# Altium footprint library eLIB.PcbLib: 206 footprints (part 6 of 13)
Each footprint in its own frame and in the unit in brackets; x right, y up, seen from the top. Pads: shape width x height; smd on the part's side, far side on the other; paste and mask are expansions set on the pad; w line width, h text height; cw(c..) or ccw(c..) is an arc to the next point about the centre after c.
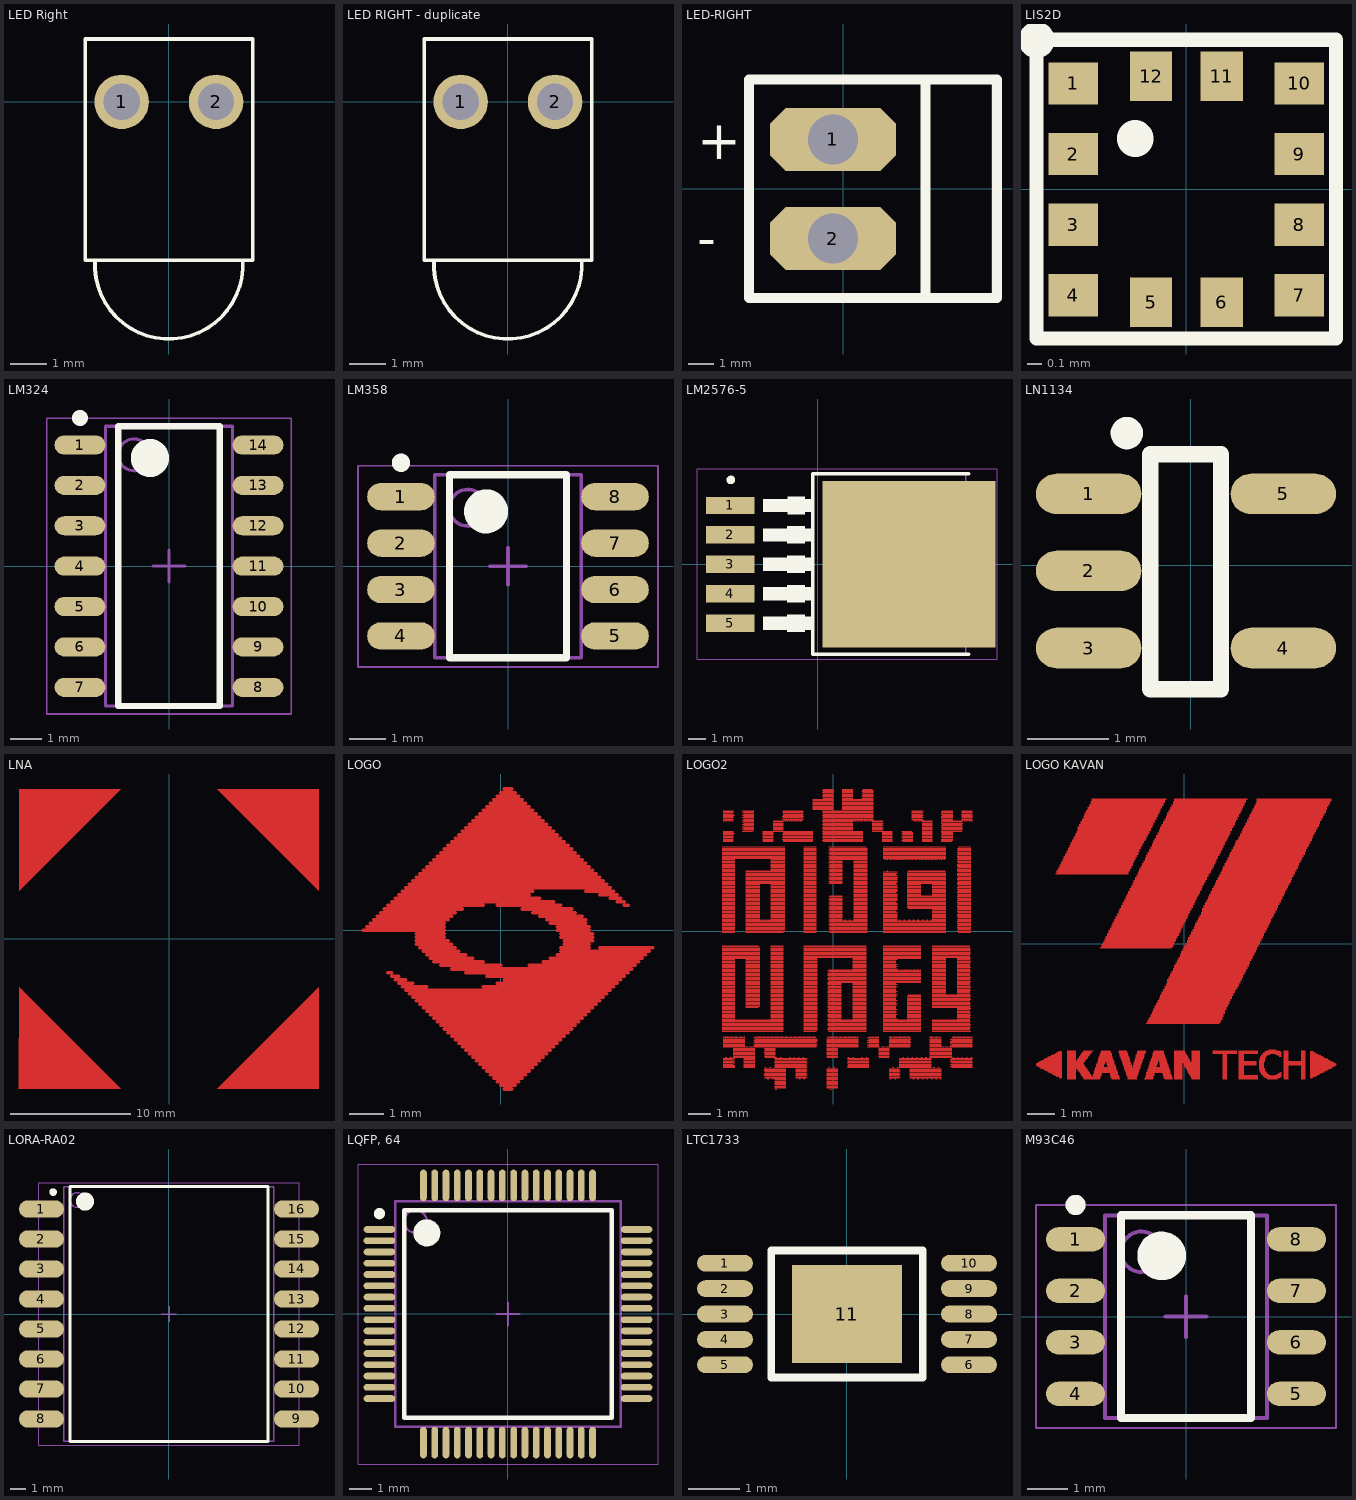
[diagram p5: the footprints below, top view; thin cyan lines are the x and y axes]

## LED Right [mm] "stand LED enclosured"
pads (2):
  round 1.5 hole 1: 1(-1.3,0) 2(1.3,0)
Top Overlay:
  lines w0.1: -2.032,-4.36 ccw(c0,-4.493) 2.032,-4.36 ; -2.3,-4.36 -2.3,1.73 2.31,1.73 2.31,-4.36 -2.3,-4.36
3D body "single LED indicator.STEP": height 6, standoff -3.35, extent -2.25,-6.53 2.25,1.67

## LED RIGHT - duplicate [mm]
pads (2):
  round 1.5 hole 1: 1(-1.3,0) 2(1.3,0)
Top Overlay:
  lines w0.1: -2.032,-4.36 ccw(c0,-4.493) 2.032,-4.36 ; -2.3,-4.36 2.31,-4.36 2.31,1.73 -2.3,1.73 -2.3,-4.36
3D body "single LED indicator.STEP": height 6, standoff -3.35, extent -2.25,-6.53 2.25,1.67

## LED-RIGHT [mil]
pads (2):
  oct 198x99 hole 78.74: 1(-16.61,77.36) 2(-16.61,-78.64)
Top Overlay:
  lines w10: -17.01,171.36 -16.61,170.97
  lines w16: 133.29,-172.15 -148.43,-172.15 -148.43,171.36 133.39,171.36 ; 129.13,-172.15 241.34,-172.15 241.34,171.36 129.13,171.36 129.13,-172.15
  text "+" at -230.31,46.46 h60
  text "-" at -230.31,-107.48 h60
Mechanical 13:
  lines w3.94: -143.31,-175 -143.31,175 235,175 235,-175 -143.31,-175
3D body: height 295.28, standoff -98.43, extent -44.16,-106.19 10.95,-51.08
3D body: height 295.28, standoff -98.43, extent -44.16,49.81 10.95,104.92
3D body: height 118.11, standoff 0, extent -144.09,-175 133.39,175
3D body: height 393.7, standoff 0, extent 133.39,-180 233.39,170

## LIS2D [mm] "accelerator"
pads (12):
  rect 0.35x0.3 smd: 1(-0.8,0.75) 2(-0.8,0.25) 3(-0.8,-0.25) 4(-0.8,-0.75) 7(0.8,-0.75) 8(0.8,-0.25) 9(0.8,0.25) 10(0.8,0.75)
  rect 0.3x0.35 smd: 5(-0.25,-0.8) 6(0.25,-0.8) 11(0.25,0.8) 12(-0.25,0.8)
Top Overlay:
  circle w0.254: c-1.062,1.06 r0.002
  circle w0.254: c-0.363,0.36 r0.002
  lines w0.1: -1.062,-1.057 1.06,-1.057 1.06,1.06 -1.062,1.06 -1.062,-1.057
3D body "User Library-LGA12_LIS2DS12.STEP": height 0.96, standoff 0, extent -0.997,-1 1.003,1

## LM324 [mm] "SOIC, 14-Leads, Body 8.65x3.90mm, Pitch 1.27mm, IPC Medium Density"
height 2.65
pads (14):
  oval 1.6x0.6 smd: 1(-2.8,3.81) 2(-2.8,2.54) 3(-2.8,1.27) 4(-2.8,0) 5(-2.8,-1.27) 6(-2.8,-2.54) 7(-2.8,-3.81) 8(2.8,-3.81) 9(2.8,-2.54) 10(2.8,-1.27) 11(2.8,0) 12(2.8,1.27) 13(2.8,2.54) 14(2.8,3.81)
Top Overlay:
  circle w0.6: c-0.6,3.4 r0.3
  circle w0.25: c-2.8,4.66 r0.125
  lines w0.2: -1.6,-4.4 1.6,-4.4 1.6,4.4 -1.6,4.4 -1.6,-4.4
Mechanical 13:
  circle w0.1: c-1.1,3.5 r0.5
  lines w0.1: -2,-4.4 2,-4.4 2,4.4 -2,4.4 -2,-4.4
Mechanical 15:
  lines w0.05: -3.85,-4.65 3.85,-4.65 3.85,4.65 -3.85,4.65 -3.85,-4.65
  lines w0.1: -0.5,0 0.5,0 ; 0,-0.5 0,0.5
3D body "SOIC127P610X265-14N.step": height 2.65, standoff 0, extent -3.075,-4.4 3.075,4.4

## LM358 [mm] "SOIC, 8-Leads, Body 4.90x3.90mm, Pitch 1.27mm, IPC Medium Density"
height 1.35
pads (8):
  oval 1.85x0.75 smd: 1(-2.925,1.905) 2(-2.925,0.635) 3(-2.925,-0.635) 4(-2.925,-1.905) 5(2.925,-1.905) 6(2.925,-0.635) 7(2.925,0.635) 8(2.925,1.905)
Top Overlay:
  circle w0.25: c-2.925,2.83 r0.125
  circle w0.6: c-0.6,1.5 r0.3
  lines w0.2: -1.6,-2.5 -1.6,2.5 1.6,2.5 1.6,-2.5 -1.6,-2.5
Mechanical 13:
  circle w0.1: c-1.1,1.6 r0.5
  lines w0.1: -2,-2.5 -2,2.5 2,2.5 2,-2.5 -2,-2.5
Mechanical 15:
  lines w0.05: -4.1,-2.75 -4.1,2.75 4.1,2.75 4.1,-2.75 -4.1,-2.75
  lines w0.1: -0.5,0 0.5,0 ; 0,-0.5 0,0.5
3D body "LM358.step": height 1.35, standoff 0, extent -3.25,-2.5 3.25,2.5

## LM2576-5 [mm]
pads (6):
  rect 2.8x1 smd: 1(-5.05,3.4) 2(-5.05,1.7) 3(-5.05,0) 4(-5.05,-1.7) 5(-5.05,-3.4)
  rect 10x9.6 smd: ""(5.27,0)
Top Overlay:
  circle w0.25: c-5.016,4.875 r0.125
  region: -1.759,-2.89 -1.759,-3.906 -0.743,-3.906 -0.743,-2.89
  region: -1.759,-1.191 -1.759,-2.207 -0.743,-2.207 -0.743,-1.191
  region: -1.759,2.209 -1.759,1.193 -0.743,1.193 -0.743,2.209
  region: -1.755,3.907 -1.755,2.891 -0.739,2.891 -0.739,3.907
  region: -3.156,-3.018 -3.156,-3.78 -0.362,-3.78 -0.362,-3.018
  region: -3.153,-1.321 -3.153,-2.083 -0.359,-2.083 -0.359,-1.321
  region: -3.156,2.082 -3.156,1.32 -0.362,1.32 -0.362,2.082
  region: -3.156,3.783 -3.156,3.021 -0.362,3.021 -0.362,3.783
  region: -1.759,0.509 -1.759,-0.507 -0.743,-0.507 -0.743,0.509
  region: -3.156,0.382 -3.156,-0.38 -0.362,-0.38 -0.362,0.382
  lines w0.203: 8.715,-5.188 -0.289,-5.188 -0.289,5.226 8.715,5.226
Mechanical 13:
  lines w0.1: -0.342,-5.181 8.548,-5.181 8.548,5.219 -0.342,5.219 -0.342,-5.181
Mechanical 15:
  lines w0.05: -6.97,-5.481 -6.97,5.519 10.355,5.519 10.355,-5.481 -6.97,-5.481
  lines w0.1: 2.235,0.019 3.235,0.019 ; 2.735,-0.481 2.735,0.519
3D body "User Library-lm2576-TO-263-1.STEP": height 4.65, standoff -0.18, extent -4.719,-5.205 9.65,5.205

## LN1134 [mm] "Low drop out regulator 300ma  SOT-23-5"
pads (5):
  oval 1.3x0.5 smd: 1(-1.26,0.88) 2(-1.26,-0.07) 3(-1.26,-1.02) 4(1.14,-1.02) 5(1.14,0.88)
Top Overlay:
  lines w0.2: -0.5,-1.53 0.37,-1.53 0.37,1.37 -0.5,1.37 -0.5,-1.53
  lines w0.254: -0.718,1.63 cw(c-0.79,1.63) -0.718,1.636
3D body "User Library-SOT23-5-5.STEP": height 1.1, standoff 0, extent -1.26,-1.53 1.14,1.37

## LNA [mm] "LNA box"
Top Layer:
  region: 12.5,-12.5 12.5,-4.016 4.016,-12.5
  region: -12.5,-12.5 -12.5,-4.016 -4.016,-12.5
  region: -12.5,12.5 -12.5,4.016 -4.016,12.5
  region: 12.5,12.5 12.5,4.016 4.016,12.5
3D body "GPS LNA.STEP": height 4, standoff 0, extent -14.34,-14.55 15.16,14.95

## LOGO [mm]
Top Layer:
  lines w0.102: -3.962,0 -1.626,0 ; -3.861,0.102 -1.626,0.102 ; -3.759,0.203 -1.626,0.203 ; -3.658,0.305 -1.524,0.305 ; -3.556,0.406 -1.422,0.406 ; -3.454,0.508 -1.321,0.508 ; -3.353,0.61 -1.118,0.61 ; -3.251,-1.219 -3.15,-1.219 ; -3.251,0.711 -0.508,0.711 ; -3.15,-1.321 -2.946,-1.321 ; -3.15,0.813 1.524,0.813 ; -3.048,-1.422 -2.743,-1.422 ; -3.048,0.914 1.118,0.914 ; -2.946,-1.524 -2.54,-1.524 ; -2.946,1.016 0.813,1.016 ; -2.845,-1.626 -2.134,-1.626 ; -2.845,1.118 0.914,1.118 ; -2.743,-1.727 3.15,-1.727 ; -2.743,1.219 3.15,1.219 ; -2.642,-1.829 3.048,-1.829 ; -2.642,1.321 3.048,1.321 ; -2.54,-1.93 2.946,-1.93 ; -2.54,1.422 2.946,1.422 ; -2.438,-2.032 2.845,-2.032 ; -2.438,-0.406 -1.422,-0.406 ; -2.438,-0.305 -1.524,-0.305 ; -2.438,-0.203 -1.626,-0.203 ; -2.438,-0.102 -1.626,-0.102 ; -2.438,1.524 2.845,1.524 ; -2.337,-2.134 2.743,-2.134 ; -2.337,-0.508 -1.321,-0.508 ; -2.337,1.626 2.743,1.626 ; -2.235,-2.235 2.642,-2.235 ; -2.235,-0.61 -1.219,-0.61 ; -2.235,1.727 2.642,1.727 ; -2.134,-2.337 2.54,-2.337 ; -2.134,-0.711 -1.016,-0.711 ; -2.134,1.829 2.54,1.829 ; -2.032,-2.438 2.438,-2.438 ; -2.032,-0.813 -0.813,-0.813 ; -2.032,1.93 2.438,1.93 ; -1.93,-2.54 2.337,-2.54 ; -1.93,-0.914 -0.508,-0.914 ; -1.93,2.032 2.337,2.032 ; -1.829,-2.642 2.235,-2.642 ; -1.829,2.134 2.235,2.134 ; -1.727,-2.743 2.134,-2.743 ; -1.727,-1.016 0,-1.016 ; -1.727,2.235 2.134,2.235 ; -1.626,-2.845 2.032,-2.845 ; -1.626,2.337 2.032,2.337 ; -1.524,-2.946 1.93,-2.946 ; -1.524,2.438 1.93,2.438 ; -1.422,-3.048 1.829,-3.048 ; -1.422,-1.118 3.759,-1.118 ; -1.422,2.54 1.829,2.54 ; -1.321,-3.15 1.727,-3.15 ; -1.321,2.642 1.727,2.642 ; -1.219,-3.251 1.626,-3.251 ; -1.219,2.743 1.626,2.743 ; -1.118,-3.353 1.524,-3.353 ; -1.118,2.845 1.524,2.845 ; -1.016,-3.454 1.422,-3.454 ; -1.016,-1.219 3.658,-1.219 ; -1.016,2.946 1.422,2.946 ; -0.914,-3.556 1.321,-3.556 ; -0.914,3.048 1.321,3.048 ; -0.813,-3.658 1.219,-3.658 ; -0.813,3.15 1.219,3.15 ; -0.711,-3.759 1.118,-3.759 ; -0.711,3.251 1.118,3.251 ; -0.61,-3.861 1.016,-3.861 ; -0.61,3.353 1.016,3.353 ; -0.508,-3.962 0.914,-3.962 ; -0.508,-1.626 3.251,-1.626 ; -0.508,3.454 0.914,3.454 ; -0.406,-4.064 0.813,-4.064 ; -0.406,-1.321 3.556,-1.321 ; -0.406,3.556 0.813,3.556 ; -0.305,-4.166 0.711,-4.166 ; -0.305,3.658 0.711,3.658 ; -0.203,-4.267 0.61,-4.267 ; -0.203,3.759 0.61,3.759 ; -0.102,-4.369 0.508,-4.369 ; -0.102,-1.524 3.353,-1.524 ; -0.102,0.711 1.727,0.711 ; -0.102,3.861 0.508,3.861 ; 0,-4.47 0.406,-4.47 ; 0,3.962 0.406,3.962 ; 0.102,-4.572 0.305,-4.572 ; 0.102,-1.422 3.454,-1.422 ; 0.102,4.064 0.305,4.064 ; 0.61,0.61 2.032,0.61 ; 0.813,-1.016 3.861,-1.016 ; 0.914,0.508 2.134,0.508 ; 1.118,0.406 2.337,0.406 ; 1.219,-0.914 3.962,-0.914 ; 1.321,0.305 2.438,0.305 ; 1.422,-0.813 4.064,-0.813 ; 1.422,0.203 2.438,0.203 ; 1.626,-0.711 4.166,-0.711 ; 1.626,0 2.54,0 ; 1.626,0.102 2.54,0.102 ; 1.727,-0.61 4.267,-0.61 ; 1.727,-0.508 2.54,-0.508 ; 1.727,-0.203 2.642,-0.203 ; 1.727,-0.102 2.642,-0.102 ; 1.829,-0.406 2.54,-0.406 ; 1.829,-0.305 2.642,-0.305 ; 2.438,1.118 3.251,1.118 ; 2.845,-0.508 4.369,-0.508 ; 2.845,1.016 3.353,1.016 ; 3.15,0.914 3.454,0.914 ; 3.353,0.813 3.556,0.813 ; 3.556,0.711 3.658,0.711
Top Solder:
  lines w0.102: -3.962,0 -1.626,0 ; -3.861,0.102 -1.626,0.102 ; -3.759,0.203 -1.626,0.203 ; -3.658,0.305 -1.524,0.305 ; -3.556,0.406 -1.422,0.406 ; -3.454,0.508 -1.321,0.508 ; -3.353,0.61 -1.118,0.61 ; -3.251,-1.219 -3.15,-1.219 ; -3.251,0.711 -0.508,0.711 ; -3.15,-1.321 -2.946,-1.321 ; -3.15,0.813 1.524,0.813 ; -3.048,-1.422 -2.743,-1.422 ; -3.048,0.914 1.118,0.914 ; -2.946,-1.524 -2.54,-1.524 ; -2.946,1.016 0.813,1.016 ; -2.845,-1.626 -2.134,-1.626 ; -2.845,1.118 0.914,1.118 ; -2.743,-1.727 3.15,-1.727 ; -2.743,1.219 3.15,1.219 ; -2.642,-1.829 3.048,-1.829 ; -2.642,1.321 3.048,1.321 ; -2.54,-1.93 2.946,-1.93 ; -2.54,1.422 2.946,1.422 ; -2.438,-2.032 2.845,-2.032 ; -2.438,-0.406 -1.422,-0.406 ; -2.438,-0.305 -1.524,-0.305 ; -2.438,-0.203 -1.626,-0.203 ; -2.438,-0.102 -1.626,-0.102 ; -2.438,1.524 2.845,1.524 ; -2.337,-2.134 2.743,-2.134 ; -2.337,-0.508 -1.321,-0.508 ; -2.337,1.626 2.743,1.626 ; -2.235,-2.235 2.642,-2.235 ; -2.235,-0.61 -1.219,-0.61 ; -2.235,1.727 2.642,1.727 ; -2.134,-2.337 2.54,-2.337 ; -2.134,-0.711 -1.016,-0.711 ; -2.134,1.829 2.54,1.829 ; -2.032,-2.438 2.438,-2.438 ; -2.032,-0.813 -0.813,-0.813 ; -2.032,1.93 2.438,1.93 ; -1.93,-2.54 2.337,-2.54 ; -1.93,-0.914 -0.508,-0.914 ; -1.93,2.032 2.337,2.032 ; -1.829,-2.642 2.235,-2.642 ; -1.829,2.134 2.235,2.134 ; -1.727,-2.743 2.134,-2.743 ; -1.727,-1.016 0,-1.016 ; -1.727,2.235 2.134,2.235 ; -1.626,-2.845 2.032,-2.845 ; -1.626,2.337 2.032,2.337 ; -1.524,-2.946 1.93,-2.946 ; -1.524,2.438 1.93,2.438 ; -1.422,-3.048 1.829,-3.048 ; -1.422,-1.118 3.759,-1.118 ; -1.422,2.54 1.829,2.54 ; -1.321,-3.15 1.727,-3.15 ; -1.321,2.642 1.727,2.642 ; -1.219,-3.251 1.626,-3.251 ; -1.219,2.743 1.626,2.743 ; -1.118,-3.353 1.524,-3.353 ; -1.118,2.845 1.524,2.845 ; -1.016,-3.454 1.422,-3.454 ; -1.016,-1.219 3.658,-1.219 ; -1.016,2.946 1.422,2.946 ; -0.914,-3.556 1.321,-3.556 ; -0.914,3.048 1.321,3.048 ; -0.813,-3.658 1.219,-3.658 ; -0.813,3.15 1.219,3.15 ; -0.711,-3.759 1.118,-3.759 ; -0.711,3.251 1.118,3.251 ; -0.61,-3.861 1.016,-3.861 ; -0.61,3.353 1.016,3.353 ; -0.508,-3.962 0.914,-3.962 ; -0.508,-1.626 3.251,-1.626 ; -0.508,3.454 0.914,3.454 ; -0.406,-4.064 0.813,-4.064 ; -0.406,-1.321 3.556,-1.321 ; -0.406,3.556 0.813,3.556 ; -0.305,-4.166 0.711,-4.166 ; -0.305,3.658 0.711,3.658 ; -0.203,-4.267 0.61,-4.267 ; -0.203,3.759 0.61,3.759 ; -0.102,-4.369 0.508,-4.369 ; -0.102,-1.524 3.353,-1.524 ; -0.102,0.711 1.727,0.711 ; -0.102,3.861 0.508,3.861 ; 0,-4.47 0.406,-4.47 ; 0,3.962 0.406,3.962 ; 0.102,-4.572 0.305,-4.572 ; 0.102,-1.422 3.454,-1.422 ; 0.102,4.064 0.305,4.064 ; 0.61,0.61 2.032,0.61 ; 0.813,-1.016 3.861,-1.016 ; 0.914,0.508 2.134,0.508 ; 1.118,0.406 2.337,0.406 ; 1.219,-0.914 3.962,-0.914 ; 1.321,0.305 2.438,0.305 ; 1.422,-0.813 4.064,-0.813 ; 1.422,0.203 2.438,0.203 ; 1.626,-0.711 4.166,-0.711 ; 1.626,0 2.54,0 ; 1.626,0.102 2.54,0.102 ; 1.727,-0.61 4.267,-0.61 ; 1.727,-0.508 2.54,-0.508 ; 1.727,-0.203 2.642,-0.203 ; 1.727,-0.102 2.642,-0.102 ; 1.829,-0.406 2.54,-0.406 ; 1.829,-0.305 2.642,-0.305 ; 2.438,1.118 3.251,1.118 ; 2.845,-0.508 4.369,-0.508 ; 2.845,1.016 3.353,1.016 ; 3.15,0.914 3.454,0.914 ; 3.353,0.813 3.556,0.813 ; 3.556,0.711 3.658,0.711

## LOGO2 [mm]
Top Layer:
  drawing of 1763 lines, arcs and shapes, not listed

## LOGO KAVAN [mm]
Top Layer:
  lines w0.025: -5.379,-4.414 -4.44,-4.414 ; -5.379,-4.389 -4.44,-4.389 ; -5.379,-4.363 -4.44,-4.363 ; -5.354,-4.338 -4.44,-4.338 ; -5.329,-4.439 -4.44,-4.439 ; -5.303,-4.312 -4.44,-4.312 ; -5.278,-4.465 -4.44,-4.465 ; -5.252,-4.287 -4.44,-4.287 ; -5.227,-4.49 -4.44,-4.49 ; -5.227,-4.262 -4.44,-4.262 ; -5.202,-4.516 -4.44,-4.516 ; -5.176,-4.236 -4.44,-4.236 ; -5.125,-4.541 -4.44,-4.541 ; -5.1,-4.211 -4.44,-4.211 ; -5.075,-4.566 -4.44,-4.566 ; -5.075,-4.185 -4.44,-4.185 ; -5.049,-4.592 -4.44,-4.592 ; -5.024,-4.16 -4.44,-4.16 ; -4.973,-4.617 -4.44,-4.617 ; -4.973,-4.135 -4.44,-4.135 ; -4.948,-4.643 -4.44,-4.643 ; -4.948,-4.109 -4.44,-4.109 ; -4.897,-4.668 -4.44,-4.668 ; -4.871,-4.084 -4.44,-4.084 ; -4.846,-4.693 -4.44,-4.693 ; -4.821,-4.058 -4.44,-4.058 ; -4.795,-4.719 -4.44,-4.719 ; -4.77,-4.033 -4.44,-4.033 ; -4.744,-4.744 -4.44,-4.744 ; -4.719,-4.008 -4.44,-4.008 ; -4.694,-4.77 -4.44,-4.77 ; -4.668,-3.982 -4.44,-3.982 ; -4.643,-4.795 -4.44,-4.795 ; -4.643,-3.957 -4.44,-3.957 ; -4.617,-4.82 -4.44,-4.82 ; -4.592,-3.931 -4.44,-3.931 ; -4.541,-4.846 -4.44,-4.846 ; -4.541,-3.906 -4.465,-3.906 ; -4.516,-4.871 -4.465,-4.871 ; -4.236,-4.897 -3.932,-4.897 ; -4.236,-4.871 -3.932,-4.871 ; -4.236,-4.846 -3.932,-4.846 ; -4.236,-4.82 -3.932,-4.82 ; -4.236,-4.795 -3.932,-4.795 ; -4.236,-4.77 -3.932,-4.77 ; -4.236,-4.744 -3.932,-4.744 ; -4.236,-4.719 -3.932,-4.719 ; -4.236,-4.693 -3.932,-4.693 ; -4.236,-4.668 -3.932,-4.668 ; -4.236,-4.643 -3.932,-4.643 ; -4.236,-4.617 -3.932,-4.617 ; -4.236,-4.592 -3.932,-4.592 ; -4.236,-4.566 -3.932,-4.566 ; -4.236,-4.541 -3.932,-4.541 ; -4.236,-4.516 -3.906,-4.516 ; -4.236,-4.49 -3.576,-4.49 ; -4.236,-4.465 -3.576,-4.465 ; -4.236,-4.439 -3.601,-4.439 ; -4.236,-4.414 -3.627,-4.414 ; -4.236,-4.389 -3.652,-4.389 ; -4.236,-4.363 -3.652,-4.363 ; -4.236,-4.338 -3.678,-4.338 ; -4.236,-4.312 -3.652,-4.312 ; -4.236,-4.287 -3.627,-4.287 ; -4.236,-4.262 -3.601,-4.262 ; -4.236,-4.236 -3.932,-4.236 ; -4.236,-4.211 -3.932,-4.211 ; -4.236,-4.185 -3.932,-4.185 ; -4.236,-4.16 -3.932,-4.16 ; -4.236,-4.135 -3.932,-4.135 ; -4.236,-4.109 -3.932,-4.109 ; -4.236,-4.084 -3.932,-4.084 ; -4.236,-4.058 -3.932,-4.058 ; -4.236,-4.033 -3.932,-4.033 ; -4.236,-4.008 -3.932,-4.008 ; -4.236,-3.982 -3.932,-3.982 ; -4.236,-3.957 -3.932,-3.957 ; -4.236,-3.931 -3.932,-3.931 ; -4.236,-3.906 -3.932,-3.906 ; -4.236,-3.881 -3.932,-3.881 ; -3.906,-4.236 -3.601,-4.236 ; -3.881,-4.541 -3.525,-4.541 ; -3.881,-4.516 -3.551,-4.516 ; -3.881,-4.211 -3.576,-4.211 ; -3.855,-4.592 -3.5,-4.592 ; -3.855,-4.566 -3.525,-4.566 ; -3.855,-4.185 -3.551,-4.185 ; -3.855,-4.16 -3.525,-4.16 ; -3.83,-4.617 -3.474,-4.617 ; -3.83,-4.135 -3.5,-4.135 ; -3.805,-4.643 -3.449,-4.643 ; -3.805,-4.109 -3.5,-4.109 ; -3.805,-4.084 -3.474,-4.084 ; -3.779,-4.693 -3.424,-4.693 ; -3.779,-4.668 -3.449,-4.668 ; -3.779,-4.058 -3.449,-4.058 ; -3.754,-4.719 -3.424,-4.719 ; -3.754,-4.033 -3.424,-4.033 ; -3.728,-4.77 -3.373,-4.77 ; -3.728,-4.744 -3.398,-4.744 ; -3.728,-4.008 -3.424,-4.008 ; -3.728,-3.982 -3.398,-3.982 ; -3.703,-4.795 -3.347,-4.795 ; -3.703,-3.957 -3.373,-3.957 ; -3.678,-4.846 -3.043,-4.846 ; -3.678,-4.82 -3.347,-4.82 ; -3.678,-3.931 -3.347,-3.931 ; -3.652,-4.897 -3.068,-4.897 ; -3.652,-4.871 -3.043,-4.871 ; -3.652,-3.906 -3.347,-3.906 ; -3.652,-3.881 -3.297,-3.881 ; -3.322,-4.82 -3.043,-4.82 ; -3.322,-4.795 -3.017,-4.795 ; -3.322,-4.77 -3.017,-4.77 ; -3.297,-4.744 -3.017,-4.744 ; -3.297,-4.719 -2.992,-4.719 ; -3.271,-4.693 -2.992,-4.693 ; -3.271,-4.668 -2.408,-4.668 ; -3.271,-4.643 -2.433,-4.643 ; -3.271,-4.617 -2.433,-4.617 ; -3.246,-4.592 -2.433,-4.592 ; -3.246,-4.566 -2.458,-4.566 ; -3.22,-4.541 -2.458,-4.541 ; -3.22,-4.516 -2.458,-4.516 ; -3.22,-4.49 -2.484,-4.49 ; -3.195,-4.465 -2.916,-4.465 ; -3.195,-4.439 -2.916,-4.439 ; -3.195,-4.414 -2.916,-4.414 ; -3.195,-4.389 -2.916,-4.389 ; -3.17,-4.363 -2.89,-4.363 ; -3.17,-4.338 -2.89,-4.338 ; -3.144,-4.312 -2.89,-4.312 ; -3.144,-4.287 -2.865,-4.287 ; -3.144,-4.262 -2.865,-4.262 ; -3.119,-4.236 -2.865,-4.236 ; -3.119,-4.211 -2.56,-4.211 ; -3.119,-4.185 -2.585,-4.185 ; -3.093,-4.16 -2.585,-4.16 ; -3.093,-4.135 -2.611,-4.135 ; -3.093,-4.109 -2.611,-4.109 ; -3.068,-4.084 -2.611,-4.084 ; -3.068,-4.058 -2.636,-4.058 ; -3.068,-4.033 -2.636,-4.033 ; -3.043,-4.008 -2.636,-4.008 ; -3.043,-3.982 -2.636,-3.982 ; -3.043,-3.957 -2.662,-3.957 ; -3.017,-3.931 -2.662,-3.931 ; -3.017,-3.906 -2.687,-3.906 ; -3.017,-3.881 -2.687,-3.881 ; -2.839,-4.287 -2.535,-4.287 ; -2.839,-4.262 -2.56,-4.262 ; -2.839,-4.236 -2.56,-4.236 ; -2.814,-4.363 -2.535,-4.363 ; -2.814,-4.338 -2.535,-4.338 ; -2.814,-4.312 -2.535,-4.312 ; -2.789,-4.439 -2.484,-4.439 ; -2.789,-4.414 -2.509,-4.414 ; -2.789,-4.389 -2.509,-4.389 ; -2.763,-4.465 -2.484,-4.465 ; -2.687,-4.77 -2.382,-4.77 ; -2.687,-4.744 -2.408,-4.744 ; -2.687,-4.719 -2.408,-4.719 ; -2.687,-4.693 -2.408,-4.693 ; -2.662,-4.846 -2.357,-4.846 ; -2.662,-4.82 -2.357,-4.82 ; -2.662,-4.795 -2.382,-4.795 ; -2.636,-4.897 -2.331,-4.897 ; -2.636,-4.871 -2.357,-4.871 ; -2.382,-3.931 -2.077,-3.931 ; -2.382,-3.906 -2.077,-3.906 ; -2.382,-3.881 -2.077,-3.881 ; -2.357,-3.982 -2.052,-3.982 ; -2.357,-3.957 -2.052,-3.957 ; -2.331,-4.084 -2.027,-4.084 ; -2.331,-4.058 -2.027,-4.058 ; -2.331,-4.033 -2.027,-4.033 ; -2.331,-4.008 -2.052,-4.008 ; -2.306,-4.16 -2.001,-4.16 ; -2.306,-4.135 -2.001,-4.135 ; -2.306,-4.109 -2.001,-4.109 ; -2.281,-4.211 -1.976,-4.211 ; -2.281,-4.185 -1.976,-4.185 ; -2.255,-4.287 -1.95,-4.287 ; -2.255,-4.262 -1.95,-4.262 ; -2.255,-4.236 -1.976,-4.236 ; -2.23,-4.363 -1.925,-4.363 ; -2.23,-4.338 -1.925,-4.338 ; -2.23,-4.312 -1.95,-4.312 ; -2.204,-4.439 -1.9,-4.439 ; -2.204,-4.414 -1.9,-4.414 ; -2.204,-4.389 -1.925,-4.389 ; -2.179,-4.516 -1.595,-4.516 ; -2.179,-4.49 -1.9,-4.49 ; -2.179,-4.465 -1.9,-4.465 ; -2.154,-4.592 -1.62,-4.592 ; -2.154,-4.566 -1.62,-4.566 ; -2.154,-4.541 -1.62,-4.541 ; -2.128,-4.643 -1.646,-4.643 ; -2.128,-4.617 -1.646,-4.617 ; -2.103,-4.744 -1.671,-4.744 ; -2.103,-4.719 -1.671,-4.719 ; -2.103,-4.693 -1.671,-4.693 ; -2.103,-4.668 -1.671,-4.668 ; -2.077,-4.795 -1.696,-4.795 ; -2.077,-4.77 -1.696,-4.77 ; -2.052,-4.897 -1.722,-4.897 ; -2.052,-4.871 -1.722,-4.871 ; -2.052,-4.846 -1.722,-4.846 ; -2.052,-4.82 -1.696,-4.82 ; -1.874,-4.49 -1.595,-4.49 ; -1.874,-4.465 -1.595,-4.465 ; -1.874,-4.439 -1.569,-4.439 ; -1.849,-4.414 -1.569,-4.414 ; -1.849,-4.389 -1.569,-4.389 ; -1.823,-4.363 -1.544,-4.363 ; -1.823,-4.338 -1.544,-4.338 ; -1.823,-4.312 -1.544,-4.312 ; -1.823,-4.287 -1.519,-4.287 ; -1.798,-4.262 -1.519,-4.262 ; -1.798,-4.236 -1.519,-4.236 ; -1.798,-4.211 -1.493,-4.211 ; -1.773,-4.185 -1.493,-4.185 ; -1.773,-4.16 -1.468,-4.16 ; -1.747,-4.135 -1.468,-4.135 ; -1.747,-4.109 -1.468,-4.109 ; -1.747,-4.084 -1.442,-4.084 ; -1.747,-4.058 -1.442,-4.058 ; -1.722,-4.033 -1.442,-4.033 ; -1.722,-4.008 -1.442,-4.008 ; -1.722,-3.982 -1.417,-3.982 ; -1.696,-3.957 -1.417,-3.957 ; -1.696,-3.931 -1.392,-3.931 ; -1.696,-3.906 -1.392,-3.906 ; -1.671,-3.881 -1.392,-3.881 ; -1.442,-4.897 -1.138,-4.897 ; -1.417,-4.871 -1.138,-4.871 ; -1.417,-4.846 -1.112,-4.846 ; -1.392,-4.82 -1.112,-4.82 ; -1.392,-4.795 -1.112,-4.795 ; -1.392,-4.77 -1.087,-4.77 ; -1.366,-4.744 -1.087,-4.744 ; -1.366,-4.719 -1.087,-4.719 ; -1.366,-4.693 -1.087,-4.693 ; -1.366,-4.668 -0.503,-4.668 ; -1.341,-4.643 -0.503,-4.643 ; -1.341,-4.617 -0.503,-4.617 ; -1.315,-4.592 -0.528,-4.592 ; -1.315,-4.566 -0.528,-4.566 ; -1.315,-4.541 -0.528,-4.541 ; -1.29,-4.516 -0.553,-4.516 ; -1.29,-4.49 -0.553,-4.49 ; -1.29,-4.465 -1.011,-4.465 ; -1.29,-4.439 -1.011,-4.439 ; -1.265,-4.414 -0.985,-4.414 ; -1.265,-4.389 -0.985,-4.389 ; -1.239,-4.363 -0.96,-4.363 ; -1.239,-4.338 -0.96,-4.338 ; -1.239,-4.312 -0.96,-4.312 ; -1.239,-4.287 -0.96,-4.287 ; -1.214,-4.262 -0.934,-4.262 ; -1.214,-4.236 -0.934,-4.236 ; -1.214,-4.211 -0.655,-4.211 ; -1.188,-4.185 -0.655,-4.185 ; -1.188,-4.16 -0.655,-4.16 ; -1.163,-4.135 -0.68,-4.135 ; -1.163,-4.109 -0.68,-4.109 ; -1.163,-4.084 -0.706,-4.084 ; -1.138,-4.058 -0.706,-4.058 ; -1.138,-4.033 -0.706,-4.033 ; -1.138,-4.008 -0.731,-4.008 ; -1.138,-3.982 -0.731,-3.982 ; -1.112,-3.957 -0.731,-3.957 ; -1.112,-3.931 -0.731,-3.931 ; -1.087,-3.906 -0.757,-3.906 ; -1.087,-3.881 -0.757,-3.881 ; -0.909,-4.287 -0.63,-4.287 ; -0.909,-4.262 -0.63,-4.262 ; -0.909,-4.236 -0.655,-4.236 ; -0.884,-4.389 -0.579,-4.389 ; -0.884,-4.363 -0.604,-4.363 ; -0.884,-4.338 -0.604,-4.338 ; -0.884,-4.312 -0.604,-4.312 ; -0.858,-4.465 -0.579,-4.465 ; -0.858,-4.439 -0.579,-4.439 ; -0.858,-4.414 -0.579,-4.414 ; -0.782,-4.719 -0.477,-4.719 ; -0.782,-4.693 -0.503,-4.693 ; -0.757,-4.795 -0.452,-4.795 ; -0.757,-4.77 -0.452,-4.77 ; -0.757,-4.744 -0.477,-4.744 ; -0.731,-4.871 -0.426,-4.871 ; -0.731,-4.846 -0.426,-4.846 ; -0.731,-4.82 -0.452,-4.82 ; -0.706,-4.897 -0.426,-4.897 ; -0.35,-4.897 -0.071,-4.897 ; -0.35,-4.871 -0.071,-4.871 ; -0.35,-4.846 -0.071,-4.846 ; -0.35,-4.82 -0.071,-4.82 ; -0.35,-4.795 -0.071,-4.795 ; -0.35,-4.77 -0.071,-4.77 ; -0.35,-4.744 -0.071,-4.744 ; -0.35,-4.719 -0.071,-4.719 ; -0.35,-4.693 -0.071,-4.693 ; -0.35,-4.668 -0.071,-4.668 ; -0.35,-4.643 -0.071,-4.643 ; -0.35,-4.617 -0.071,-4.617 ; -0.35,-4.592 -0.071,-4.592 ; -0.35,-4.566 -0.071,-4.566 ; -0.35,-4.541 -0.071,-4.541 ; -0.35,-4.516 -0.071,-4.516 ; -0.35,-4.49 -0.071,-4.49 ; -0.35,-4.465 -0.071,-4.465 ; -0.35,-4.439 -0.071,-4.439 ; -0.35,-4.414 -0.071,-4.414 ; -0.35,-4.389 -0.071,-4.389 ; -0.35,-4.363 -0.071,-4.363 ; -0.35,-4.338 -0.071,-4.338 ; -0.35,-4.312 -0.071,-4.312 ; -0.35,-4.287 -0.071,-4.287 ; -0.35,-4.262 0.209,-4.262 ; -0.35,-4.236 0.209,-4.236 ; -0.35,-4.211 0.183,-4.211 ; -0.35,-4.185 0.183,-4.185 ; -0.35,-4.16 0.158,-4.16 ; -0.35,-4.135 0.158,-4.135 ; -0.35,-4.109 0.132,-4.109 ; -0.35,-4.084 0.132,-4.084 ; -0.35,-4.058 0.107,-4.058 ; -0.35,-4.033 0.082,-4.033 ; -0.35,-4.008 0.082,-4.008 ; -0.35,-3.982 0.056,-3.982 ; -0.35,-3.957 0.056,-3.957 ; -0.35,-3.931 0.031,-3.931 ; -0.35,-3.906 0.031,-3.906 ; -0.35,-3.881 0.005,-3.881 ; -0.045,-4.312 0.259,-4.312 ; -0.045,-4.287 0.234,-4.287 ; -0.02,-4.363 0.564,-4.363 ; -0.02,-4.338 0.259,-4.338 ; 0.005,-4.414 0.564,-4.414 ; 0.005,-4.389 0.564,-4.389 ; 0.031,-4.465 0.564,-4.465 ; 0.031,-4.439 0.564,-4.439 ; 0.056,-4.49 0.564,-4.49 ; 0.082,-4.541 0.564,-4.541 ; 0.082,-4.516 0.564,-4.516 ; 0.107,-4.592 0.564,-4.592 ; 0.107,-4.566 0.564,-4.566 ; 0.132,-4.643 0.564,-4.643 ; 0.132,-4.617 0.564,-4.617 ; 0.158,-4.693 0.564,-4.693 ; 0.158,-4.668 0.564,-4.668 ; 0.183,-4.719 0.564,-4.719 ; 0.209,-4.77 0.564,-4.77 ; 0.209,-4.744 0.564,-4.744 ; 0.234,-4.82 0.564,-4.82 ; 0.234,-4.795 0.564,-4.795 ; 0.259,-4.871 0.564,-4.871 ; 0.259,-4.846 0.564,-4.846 ; 0.285,-4.897 0.564,-4.897 ; 0.285,-4.338 0.564,-4.338 ; 0.285,-4.312 0.564,-4.312 ; 0.285,-4.287 0.564,-4.287 ; 0.285,-4.262 0.564,-4.262 ; 0.285,-4.236 0.564,-4.236 ; 0.285,-4.211 0.564,-4.211 ; 0.285,-4.185 0.564,-4.185 ; 0.285,-4.16 0.564,-4.16 ; 0.285,-4.135 0.564,-4.135 ; 0.285,-4.109 0.564,-4.109 ; 0.285,-4.084 0.564,-4.084 ; 0.285,-4.058 0.564,-4.058 ; 0.285,-4.033 0.564,-4.033 ; 0.285,-4.008 0.564,-4.008 ; 0.285,-3.982 0.564,-3.982 ; 0.285,-3.957 0.564,-3.957 ; 0.285,-3.931 0.564,-3.931 ; 0.285,-3.906 0.564,-3.906 ; 0.285,-3.881 0.564,-3.881 ; 1.047,-3.982 1.91,-3.982 ; 1.047,-3.957 1.91,-3.957 ; 1.047,-3.931 1.91,-3.931 ; 1.047,-3.906 1.91,-3.906 ; 1.047,-3.881 1.91,-3.881 ; 1.402,-4.897 1.555,-4.897 ; 1.402,-4.871 1.555,-4.871 ; 1.402,-4.846 1.555,-4.846 ; 1.402,-4.82 1.555,-4.82 ; 1.402,-4.795 1.555,-4.795 ; 1.402,-4.77 1.555,-4.77 ; 1.402,-4.744 1.555,-4.744 ; 1.402,-4.719 1.555,-4.719 ; 1.402,-4.693 1.555,-4.693 ; 1.402,-4.668 1.555,-4.668 ; 1.402,-4.643 1.555,-4.643 ; 1.402,-4.617 1.555,-4.617 ; 1.402,-4.592 1.555,-4.592 ; 1.402,-4.566 1.555,-4.566 ; 1.402,-4.541 1.555,-4.541 ; 1.402,-4.516 1.555,-4.516 ; 1.402,-4.49 1.555,-4.49 ; 1.402,-4.465 1.555,-4.465 ; 1.402,-4.439 1.555,-4.439 ; 1.402,-4.414 1.555,-4.414 ; 1.402,-4.389 1.555,-4.389 ; 1.402,-4.363 1.555,-4.363 ; 1.402,-4.338 1.555,-4.338 ; 1.402,-4.312 1.555,-4.312 ; 1.402,-4.287 1.555,-4.287 ; 1.402,-4.262 1.555,-4.262 ; 1.402,-4.236 1.555,-4.236 ; 1.402,-4.211 1.555,-4.211 ; 1.402,-4.185 1.555,-4.185 ; 1.402,-4.16 1.555,-4.16 ; 1.402,-4.135 1.555,-4.135 ; 1.402,-4.109 1.555,-4.109 ; 1.402,-4.084 1.555,-4.084 ; 1.402,-4.058 1.555,-4.058 ; 1.402,-4.033 1.555,-4.033 ; 1.402,-4.008 1.555,-4.008 ; 1.987,-4.897 2.672,-4.897 ; 1.987,-4.871 2.672,-4.871 ; 1.987,-4.846 2.672,-4.846 ; 1.987,-4.82 2.672,-4.82 ; 1.987,-4.795 2.672,-4.795 ; 1.987,-4.77 2.672,-4.77 ; 1.987,-4.744 2.164,-4.744 ; 1.987,-4.719 2.164,-4.719 ; 1.987,-4.693 2.164,-4.693 ; 1.987,-4.668 2.164,-4.668 ; 1.987,-4.643 2.164,-4.643 ; 1.987,-4.617 2.164,-4.617 ; 1.987,-4.592 2.164,-4.592 ; 1.987,-4.566 2.164,-4.566 ; 1.987,-4.541 2.164,-4.541 ; 1.987,-4.516 2.164,-4.516 ; 1.987,-4.49 2.164,-4.49 ; 1.987,-4.465 2.164,-4.465 ; 1.987,-4.439 2.164,-4.439 ; 1.987,-4.414 2.164,-4.414 ; 1.987,-4.389 2.622,-4.389 ; 1.987,-4.363 2.622,-4.363 ; 1.987,-4.338 2.622,-4.338 ; 1.987,-4.312 2.622,-4.312 ; 1.987,-4.287 2.622,-4.287 ; 1.987,-4.262 2.622,-4.262 ; 1.987,-4.236 2.164,-4.236 ; 1.987,-4.211 2.164,-4.211 ; 1.987,-4.185 2.164,-4.185 ; 1.987,-4.16 2.164,-4.16 ; 1.987,-4.135 2.164,-4.135 ; 1.987,-4.109 2.164,-4.109 ; 1.987,-4.084 2.164,-4.084 ; 1.987,-4.058 2.164,-4.058 ; 1.987,-4.033 2.164,-4.033 ; 1.987,-4.008 2.164,-4.008 ; 1.987,-3.982 2.672,-3.982 ; 1.987,-3.957 2.672,-3.957 ; 1.987,-3.931 2.672,-3.931 ; 1.987,-3.906 2.672,-3.906 ; 1.987,-3.881 2.672,-3.881 ; 2.723,-4.541 2.926,-4.541 ; 2.723,-4.516 2.926,-4.516 ; 2.723,-4.49 2.901,-4.49 ; 2.723,-4.465 2.901,-4.465 ; 2.723,-4.439 2.901,-4.439 ; 2.723,-4.414 2.901,-4.414 ; 2.723,-4.389 2.901,-4.389 ; 2.723,-4.363 2.901,-4.363 ; 2.723,-4.338 2.901,-4.338 ; 2.723,-4.312 2.901,-4.312 ; 2.723,-4.287 2.901,-4.287 ; 2.723,-4.262 2.926,-4.262 ; 2.723,-4.236 2.926,-4.236 ; 2.749,-4.617 2.952,-4.617 ; 2.749,-4.592 2.926,-4.592 ; 2.749,-4.566 2.926,-4.566 ; 2.749,-4.211 2.926,-4.211 ; 2.749,-4.185 2.926,-4.185 ; 2.749,-4.16 2.952,-4.16 ; 2.774,-4.668 2.977,-4.668 ; 2.774,-4.643 2.977,-4.643 ; 2.774,-4.135 2.952,-4.135 ; 2.774,-4.109 2.977,-4.109 ; 2.799,-4.719 3.028,-4.719 ; 2.799,-4.693 3.003,-4.693 ; 2.799,-4.084 2.977,-4.084 ; 2.799,-4.058 3.003,-4.058 ; 2.825,-4.744 3.079,-4.744 ; 2.825,-4.033 3.053,-4.033 ; 2.85,-4.77 3.155,-4.77 ; 2.85,-4.008 3.104,-4.008 ; 2.85,-3.982 3.536,-3.982 ; 2.876,-4.795 3.536,-4.795 ; 2.876,-3.957 3.536,-3.957 ; 2.901,-4.82 3.536,-4.82 ; 2.926,-4.846 3.485,-4.846 ; 2.926,-3.931 3.536,-3.931 ; 2.952,-3.906 3.485,-3.906 ; 2.977,-4.871 3.434,-4.871 ; 3.003,-3.881 3.434,-3.881 ; 3.028,-4.897 3.384,-4.897 ; 3.079,-3.855 3.333,-3.855 ; 3.257,-4.77 3.536,-4.77 ; 3.333,-4.008 3.536,-4.008 ; 3.358,-4.744 3.536,-4.744 ; 3.384,-4.033 3.536,-4.033 ; 3.409,-4.719 3.536,-4.719 ; 3.434,-4.058 3.536,-4.058 ; 3.46,-4.693 3.536,-4.693 ; 3.46,-4.084 3.536,-4.084 ; 3.485,-4.668 3.536,-4.668 ; 3.612,-4.871 3.79,-4.871 ; 3.612,-4.846 3.79,-4.846 ; 3.612,-4.82 3.79,-4.82 ; 3.612,-4.795 3.79,-4.795 ; 3.612,-4.77 3.79,-4.77 ; 3.612,-4.744 3.79,-4.744 ; 3.612,-4.719 3.79,-4.719 ; 3.612,-4.693 3.79,-4.693 ; 3.612,-4.668 3.79,-4.668 ; 3.612,-4.643 3.79,-4.643 ; 3.612,-4.617 3.79,-4.617 ; 3.612,-4.592 3.79,-4.592 ; 3.612,-4.566 3.79,-4.566 ; 3.612,-4.541 3.79,-4.541 ; 3.612,-4.516 3.79,-4.516 ; 3.612,-4.49 3.79,-4.49 ; 3.612,-4.465 3.79,-4.465 ; 3.612,-4.439 3.79,-4.439 ; 3.612,-4.414 3.79,-4.414 ; 3.612,-4.389 4.4,-4.389 ; 3.612,-4.363 4.4,-4.363 ; 3.612,-4.338 4.4,-4.338 ; 3.612,-4.312 4.4,-4.312 ; 3.612,-4.287 4.4,-4.287 ; 3.612,-4.262 4.4,-4.262 ; 3.612,-4.236 3.79,-4.236 ; 3.612,-4.211 3.79,-4.211 ; 3.612,-4.185 3.79,-4.185 ; 3.612,-4.16 3.79,-4.16 ; 3.612,-4.135 3.79,-4.135 ; 3.612,-4.109 3.79,-4.109 ; 3.612,-4.084 3.79,-4.084 ; 3.612,-4.058 3.79,-4.058 ; 3.612,-4.033 3.79,-4.033 ; 3.612,-4.008 3.79,-4.008 ; 3.612,-3.982 3.79,-3.982 ; 3.612,-3.957 3.79,-3.957 ; 3.612,-3.931 3.79,-3.931 ; 3.612,-3.906 3.79,-3.906 ; 3.612,-3.881 3.79,-3.881 ; 3.638,-4.897 3.79,-4.897 ; 4.247,-4.897 4.4,-4.897 ; 4.247,-4.871 4.4,-4.871 ; 4.247,-4.846 4.4,-4.846 ; 4.247,-4.82 4.4,-4.82 ; 4.247,-4.795 4.4,-4.795 ; 4.247,-4.77 4.4,-4.77 ; 4.247,-4.744 4.4,-4.744 ; 4.247,-4.719 4.4,-4.719 ; 4.247,-4.693 4.4,-4.693 ; 4.247,-4.668 4.4,-4.668 ; 4.247,-4.643 4.4,-4.643 ; 4.247,-4.617 4.4,-4.617 ; 4.247,-4.592 4.4,-4.592 ; 4.247,-4.566 4.4,-4.566 ; 4.247,-4.541 4.4,-4.541 ; 4.247,-4.516 4.4,-4.516 ; 4.247,-4.49 4.4,-4.49 ; 4.247,-4.465 4.4,-4.465 ; 4.247,-4.439 4.4,-4.439 ; 4.247,-4.414 4.4,-4.414 ; 4.247,-4.236 4.4,-4.236 ; 4.247,-4.211 4.4,-4.211 ; 4.247,-4.185 4.4,-4.185 ; 4.247,-4.16 4.4,-4.16 ; 4.247,-4.135 4.4,-4.135 ; 4.247,-4.109 4.4,-4.109 ; 4.247,-4.084 4.4,-4.084 ; 4.247,-4.058 4.4,-4.058 ; 4.247,-4.033 4.4,-4.033 ; 4.247,-4.008 4.4,-4.008 ; 4.247,-3.982 4.4,-3.982 ; 4.247,-3.957 4.4,-3.957 ; 4.247,-3.931 4.4,-3.931 ; 4.247,-3.906 4.4,-3.906 ; 4.247,-3.881 4.4,-3.881 ; 4.577,-4.846 4.679,-4.846 ; 4.577,-4.82 4.755,-4.82 ; 4.577,-4.795 4.806,-4.795 ; 4.577,-4.77 4.831,-4.77 ; 4.577,-4.744 4.882,-4.744 ; 4.577,-4.719 4.933,-4.719 ; 4.577,-4.693 4.984,-4.693 ; 4.577,-4.668 5.035,-4.668 ; 4.577,-4.643 5.085,-4.643 ; 4.577,-4.617 5.111,-4.617 ; 4.577,-4.592 5.187,-4.592 ; 4.577,-4.566 5.212,-4.566 ; 4.577,-4.541 5.263,-4.541 ; 4.577,-4.516 5.339,-4.516 ; 4.577,-4.49 5.365,-4.49 ; 4.577,-4.465 5.416,-4.465 ; 4.577,-4.439 5.466,-4.439 ; 4.577,-4.414 5.492,-4.414 ; 4.577,-4.389 5.517,-4.389 ; 4.577,-4.363 5.517,-4.363 ; 4.577,-4.338 5.492,-4.338 ; 4.577,-4.312 5.441,-4.312 ; 4.577,-4.287 5.39,-4.287 ; 4.577,-4.262 5.339,-4.262 ; 4.577,-4.236 5.289,-4.236 ; 4.577,-4.211 5.238,-4.211 ; 4.577,-4.185 5.212,-4.185 ; 4.577,-4.16 5.136,-4.16 ; 4.577,-4.135 5.085,-4.135 ; 4.577,-4.109 5.06,-4.109 ; 4.577,-4.084 5.009,-4.084 ; 4.577,-4.058 4.958,-4.058 ; 4.577,-4.033 4.908,-4.033 ; 4.577,-4.008 4.857,-4.008 ; 4.577,-3.982 4.806,-3.982 ; 4.577,-3.957 4.781,-3.957 ; 4.577,-3.931 4.704,-3.931 ; 4.577,-3.906 4.679,-3.906 ; 4.603,-4.871 4.654,-4.871